# Altium footprint library Cty1.PcbLib: 1378 footprints (part 61 of 87)
Each footprint in its own frame and in the unit in brackets; x right, y up, seen from the top. Pads: shape width x height; smd on the part's side, far side on the other; paste and mask are expansions set on the pad; w line width, h text height; cw(c..) or ccw(c..) is an arc to the next point about the centre after c.
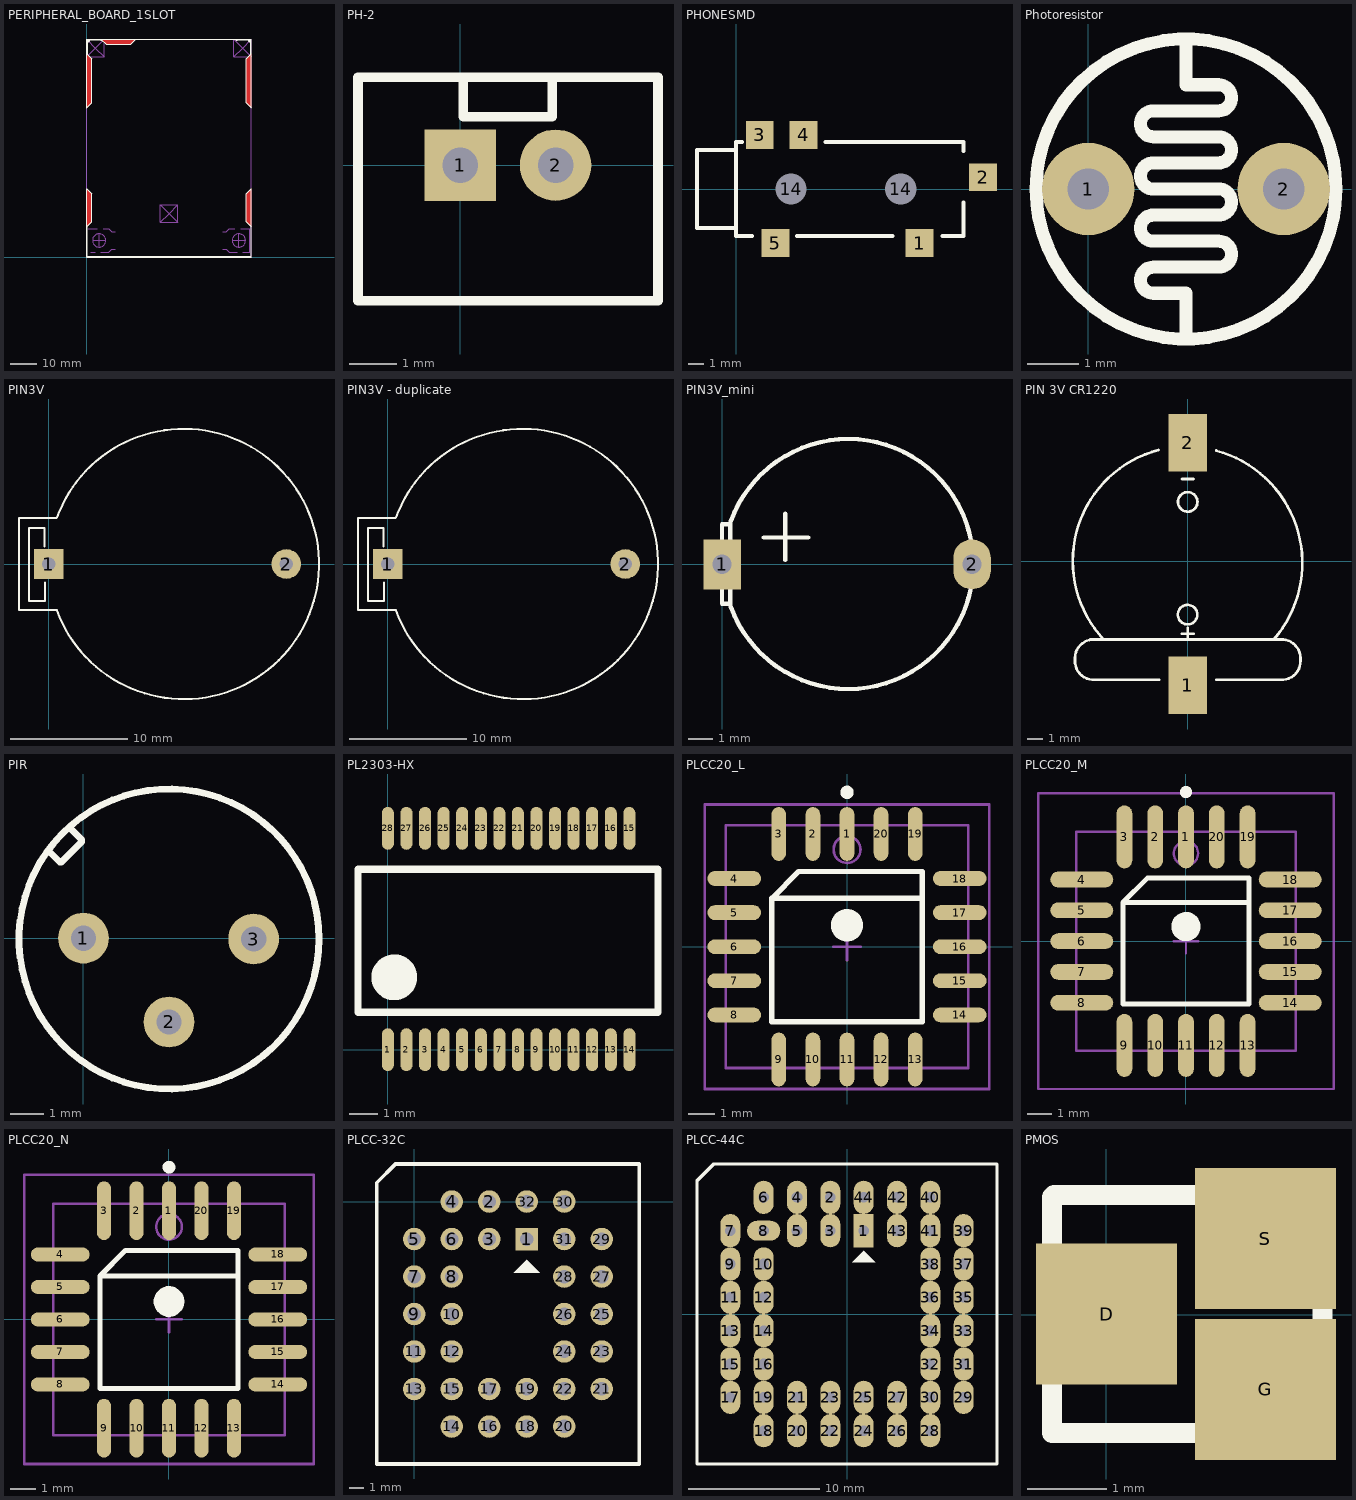
[diagram p60: the footprints below, top view; thin cyan lines are the x and y axes]

## PERIPHERAL_BOARD_1SLOT [mm]
Top Layer:
  region: 18.5,82 16.6,80.1 7.3,80.1 5.4,82
  region: 0,56.3 1.9,58.2 1.9,74.7 0,76.6
  region: 0,11.5 1.9,13.4 1.9,23.8 0,25.7
  region: 62,56.3 60.1,58.2 60.1,74.7 62,76.6
  region: 62,11.5 60.1,13.4 60.1,23.8 62,25.7
Top Overlay:
  region: 0.4,11.8 0,11.8 0,0 0.4,0
  region: 0,0.4 0,0 62,0 62,0.4
  rectangle: 0,81.2 0.8,82
  region: 0,81.5 0,76.6 0.5,76.6 0.5,81.5
  rectangle: 0.5,81.5 5.4,82
  rectangle: 61.6,0 62,11.8
  region: 62,82 61.2,82 61.2,81.2 62,81.2
  region: 61.5,81.5 61.5,76.6 62,76.6 62,81.5
  region: 61.5,82 56.6,82 56.6,81.5 61.5,81.5
  region: 0.5,76.6 0.5,76.1 0,76.6
  region: 0,80.3 1,81.3 0,81.3
  region: 0.7,81 1.7,82 0.7,82
  region: 5.4,81.5 5.9,81.5 5.4,82
  region: 61.5,76.6 61.5,76.1 62,76.6
  region: 62,80.3 61,81.3 62,81.3
  region: 61.3,81 60.3,82 61.3,82
  region: 56.6,81.5 56.1,81.5 56.6,82
  lines w0.2: 0,11.5 1.9,13.4 1.9,23.8 0,25.7 0,0 62,0 62,25.7 60.1,23.8 60.1,13.4 62,11.5 ; 18.5,82 16.6,80.1 7.3,80.1 5.4,82 ; 0,76.6 0,82 5.4,82 ; 0,76.6 0,56.3 1.9,58.2 1.9,74.7 0,76.6 ; 5.4,82 17.5,82 44.5,82 56.6,82 62,82 62,76.6 ; 62,76.6 62,56.3 60.1,58.2 60.1,74.7 62,76.6
Top Solder:
  region: 0,25.7 0,11.521 1.9,13.4 1.9,23.8
  region: 5.346,82.133 18.554,82.133 16.6,80.1 7.3,80.1
  region: 0,76.545 0,56.3 1.9,58.2 1.917,74.639
  region: 62,25.7 62,11.521 60.1,13.4 60.1,23.8
  region: 62,76.672 62,56.3 60.1,58.2 60.1,74.7
Mechanical 5:
  circle w0.1: c4.7,6.3 r2.5
  circle w0.1: c57.3,6.3 r2.5
  lines w0.1: 0.65,10.7 4.04,10.7 ; 1.6,1.9 3.24,1.9 ; 2.21,6.3 7.2,6.3 ; 4.7,3.8 4.7,8.79 ; 5.36,1.9 8.35,1.9 9.4,2.95 10.75,2.95 ; 6.16,10.7 8.35,10.7 9.4,9.65 10.75,9.65 ; 51.25,2.95 52.6,2.95 53.65,1.9 56.64,1.9 ; 51.25,9.65 52.6,9.65 53.65,10.7 55.84,10.7 ; 54.81,6.3 59.8,6.3 ; 57.3,3.8 57.3,8.79 ; 57.96,10.7 61.35,10.7 61.35,1.9 58.76,1.9 ; 0,75.4 6.6,75.4 ; 0,75.4 0,82 ; 0,75.4 3.3,78.7 ; 0,82 6.6,82 ; 0,82 3.3,78.7 ; 0,82 0,0 62,0 62,82 ; 0,82 62,82 ; 3.3,78.7 6.6,82 ; 3.3,78.7 6.6,75.4 ; 6.6,75.4 6.6,82 ; 27.7,13.1 31,16.4 ; 27.7,13.1 27.7,19.7 ; 27.7,13.1 34.3,13.1 ; 27.7,19.7 31,16.4 ; 27.7,19.7 34.3,19.7 ; 31,16.4 34.3,13.1 ; 31,16.4 34.3,19.7 ; 34.3,13.1 34.3,19.7 ; 55.4,75.4 58.7,78.7 ; 55.4,75.4 62,75.4 ; 55.4,75.4 55.4,82 ; 55.4,82 62,82 ; 55.4,82 58.7,78.7 ; 55.4,82 62,82 ; 58.7,78.7 62,75.4 ; 58.7,78.7 62,82 ; 62,75.4 62,82

## PH-2 [mm]
pads (2):
  rect 1.5x1.5 hole 0.75: 1(0,0)
  round 1.5 hole 0.75: 2(2,0)
Top Overlay:
  lines w0.2: 0.061,1.845 0.061,1.016 1.931,1.016 1.931,1.845 ; -2.15,-2.85 4.15,-2.85 4.15,1.85 -2.15,1.85 -2.15,-2.85
Mechanical 7:
  lines w0.2: -0.645,-0.628 0.625,-0.628 0.625,0.642 -0.645,0.642 -0.645,-0.628
3D body "SW3dPS-b2b-ph-ks-1.STEP": height 6, standoff -3, extent -1.934,-2.722 3.966,1.778

## PHONESMD [mm]
pads (7):
  rect 1.778x1.778 smd: 1(11.7,-3.45) 2(15.75,0.75) 3(1.5,3.45) 4(4.3,3.45) 5(2.5,-3.45)
  round 1.778 hole 2 unplated: 14(3.5,0) 14(10.5,0)
Top Overlay:
  lines w0.254: 0,-2.5 -2.5,-2.5 -2.5,2.5 0,2.5 ; 0.381,3 0,3 0,-3 1.016,-3 ; 3.889,-3 9.985,-3 ; 5.7,3 14.5,3 14.5,2.435 ; 13.16,-3 14.5,-3 14.5,-0.867

## Photoresistor [mm]
pads (2):
  round 1.8 hole 0.8: 1(0,0) 2(3.81,0)
Top Overlay:
  circle w0.254: c1.905,0 r2.924
  lines w0.254: 1.905,-2.921 1.905,-2.032 1.27,-2.032 cw(c1.27,-1.778) 1.27,-1.524 2.54,-1.524 ccw(c2.54,-1.27) 2.54,-1.016 1.27,-1.016 cw(c1.27,-0.762) 1.27,-0.508 2.54,-0.508 ccw(c2.54,-0.254) 2.54,0 1.27,0 cw(c1.27,0.254) 1.27,0.508 2.54,0.508 ccw(c2.54,0.762) 2.54,1.016 1.27,1.016 cw(c1.27,1.27) 1.27,1.524 2.54,1.524 ccw(c2.54,1.778) 2.54,2.032 1.905,2.032 1.905,2.921

## PIN3V [mil] "Socket PIN 3V"
pads (2):
  rect 100x100 hole 45: 1(0,0)
  round 100 hole 45: 2(800,0)
Top Overlay:
  lines w7: -14,59 -14,121 -66,121 -66,-124 -13,-124 -13,-63 ; 26.33,155 -100,155 -100,-155 27.93,-155 ; 27.6,156.07 cw(c455,0) 27.93,-156.97
3D body "batter2.STEP": height 278.16, standoff -137.2, extent -128.09,-446.83 1001.83,448.83

## PIN3V - duplicate [mil] "Socket PIN 3V"
pads (2):
  rect 100x100 hole 45: 1(0,0)
  round 100 hole 45: 2(800,0)
Top Overlay:
  lines w7: -14,59 -14,121 -66,121 -66,-124 -13,-124 -13,-63 ; 26.33,155 -100,155 -100,-155 27.93,-155 ; 27.6,156.07 cw(c455,0) 27.93,-156.97
3D body "batter2.STEP": height 278.16, standoff -137.2, extent -128.09,-446.83 1001.83,448.83
3D body "CR 2032 Lithium Cell.step": height 236.22, standoff 110.24, extent 167.6,-403.7 955,383.7

## PIN3V_mini [mil] "Socket PIN 3V"
pads (2):
  rect 60x80 hole 31: 1(0,0)
  oval 60x80 hole 31: 2(400,0)
Top Overlay:
  lines w7: 11,64 0,64 0,-63 13,-63 ; 13,-64 13,65 ; 14,-67.81 ccw(c201.94,0.6) 14,69 ; 67,43 138,43 ; 101,7 101,81

## PIN 3V CR1220 [mil]
pads (2):
  rect 100x150 smd mask+8: 1(0,-325) 2(0,310)
Top Overlay:
  circle w7: c-0.5,-140 r25.5
  circle w7: c0,155 r25.5
  lines w7: -255,-205 250,-205 cw(c245,-255) 295,-260 cw(c247.5,-262.5) 250,-310 75,-310 ; -250,-205 ccw(c-245,-255) -295,-260 ccw(c-247.5,-262.5) -250,-310 -75,-310 ; -220,-205 cw(c0,0) -76.53,290.81 ; -15,-190 15,-190 ; -15,215 15,215 ; 0,-205 0,-175 ; 74.24,289.31 cw(c-5,-5) 225,-205
3D body "CR1220 battery.STEP": height 159.49, standoff -35, extent -295.42,-364.17 295,364.17

## PIR [mil] "Xtal for RF"
pads (3):
  round 60 hole 30: 1(0,0) 2(101,-99) 3(201,-1)
Top Overlay:
  circle w8: c101,-1 r177.17
  lines w8: -41,103 -28,90 -26,90 -2,114 -2,116 -15,129

## PL2303-HX [mil]
pads (28):
  oval 16.53x59.03 smd mask+7.9: 1(0,0) 2(25.6,0) 3(51.18,0) 4(76.78,0) 5(102.37,0) 6(127.97,0) 7(153.57,0) 8(179.15,0) 9(204.75,0) 10(230.35,0) 11(255.93,0) 12(281.53,0) 13(307.12,0) 14(332.7,0) 15(332.7,305) 16(307.12,305) 17(281.53,305) 18(255.93,305) 19(230.35,305) 20(204.75,305) 21(179.15,305) 22(153.57,305) 23(127.97,305) 24(102.37,305) 25(76.78,305) 26(51.18,305) 27(25.6,305) 28(0,305)
Top Overlay:
  circle w39.37: c8.8,99.7 r11.88
  lines w10: -41.22,51.66 -41.22,248.53 372.21,248.53 372.21,51.66 -41.22,51.66
3D body "SOP65P770x200-28N.step": height 84.65, standoff 0, extent -37.01,0.01 369.69,305.35

## PLCC20_L [mm] "Leaded Chip Carrier, 20-Leads, Body 9x9mm, Pitch 1.27mm, IPC High Density"
height 4.57
pads (20):
  oval 0.55x2 smd: 1(0,4.2) 2(-1.27,4.2) 3(-2.54,4.2) 9(-2.54,-4.2) 10(-1.27,-4.2) 11(0,-4.2) 12(1.27,-4.2) 13(2.54,-4.2) 19(2.54,4.2) 20(1.27,4.2)
  oval 2x0.55 smd: 4(-4.2,2.54) 5(-4.2,1.27) 6(-4.2,0) 7(-4.2,-1.27) 8(-4.2,-2.54) 14(4.2,-2.54) 15(4.2,-1.27) 16(4.2,0) 17(4.2,1.27) 18(4.2,2.54)
Top Overlay:
  circle w0.6: c0,0.8 r0.3
  circle w0.25: c0,5.75 r0.125
  lines w0.2: 2.8,1.8 -2.8,1.8 ; -2.8,1.8 -2.8,-2.8 2.8,-2.8 2.8,2.8 -1.8,2.8 -2.8,1.8
Mechanical 13:
  circle w0.1: c0,3.62 r0.5
  lines w0.1: -4.52,-4.52 4.52,-4.52 4.52,4.52 -4.52,4.52 -4.52,-4.52
Mechanical 15:
  lines w0.1: -0.5,0 0.5,0 ; 0,-0.5 0,0.5 ; -5.3,-5.3 5.3,-5.3 5.3,5.3 -5.3,5.3 -5.3,-5.3
3D body: height 4.57, standoff 0, extent -4.52,-4.52 4.52,4.52

## PLCC20_M [mm] "Leaded Chip Carrier, 20-Leads, Body 9x9mm, Pitch 1.27mm, IPC Low Density"
height 4.57
pads (20):
  oval 0.65x2.6 smd: 1(0,4.3) 2(-1.27,4.3) 3(-2.54,4.3) 9(-2.54,-4.3) 10(-1.27,-4.3) 11(0,-4.3) 12(1.27,-4.3) 13(2.54,-4.3) 19(2.54,4.3) 20(1.27,4.3)
  oval 2.6x0.65 smd: 4(-4.3,2.54) 5(-4.3,1.27) 6(-4.3,0) 7(-4.3,-1.27) 8(-4.3,-2.54) 14(4.3,-2.54) 15(4.3,-1.27) 16(4.3,0) 17(4.3,1.27) 18(4.3,2.54)
Top Overlay:
  circle w0.25: c0,6.15 r0.125
  circle w0.6: c0,0.6 r0.3
  lines w0.2: 2.6,1.6 -2.6,1.6 ; -2.6,1.6 -1.6,2.6 2.6,2.6 2.6,-2.6 -2.6,-2.6 -2.6,1.6
Mechanical 13:
  circle w0.1: c0,3.62 r0.5
  lines w0.1: -4.52,-4.52 -4.52,4.52 4.52,4.52 4.52,-4.52 -4.52,-4.52
Mechanical 15:
  lines w0.1: -0.5,0 0.5,0 ; 0,-0.5 0,0.5 ; -6.1,-6.1 -6.1,6.1 6.1,6.1 6.1,-6.1 -6.1,-6.1
3D body: height 4.57, standoff 0, extent -4.52,-4.52 4.52,4.52

## PLCC20_N [mm] "Leaded Chip Carrier, 20-Leads, Body 9x9mm, Pitch 1.27mm, IPC Medium Density"
height 4.57
pads (20):
  oval 0.55x2.3 smd: 1(0,4.25) 2(-1.27,4.25) 3(-2.54,4.25) 9(-2.54,-4.25) 10(-1.27,-4.25) 11(0,-4.25) 12(1.27,-4.25) 13(2.54,-4.25) 19(2.54,4.25) 20(1.27,4.25)
  oval 2.3x0.55 smd: 4(-4.25,2.54) 5(-4.25,1.27) 6(-4.25,0) 7(-4.25,-1.27) 8(-4.25,-2.54) 14(4.25,-2.54) 15(4.25,-1.27) 16(4.25,0) 17(4.25,1.27) 18(4.25,2.54)
Top Overlay:
  circle w0.6: c0,0.7 r0.3
  circle w0.25: c0,5.95 r0.125
  lines w0.2: 2.7,1.7 -2.7,1.7 ; -2.7,1.7 -2.7,-2.7 2.7,-2.7 2.7,2.7 -1.7,2.7 -2.7,1.7
Mechanical 13:
  circle w0.1: c0,3.62 r0.5
  lines w0.1: -4.52,-4.52 4.52,-4.52 4.52,4.52 -4.52,4.52 -4.52,-4.52
Mechanical 15:
  lines w0.1: -0.5,0 0.5,0 ; 0,-0.5 0,0.5 ; -5.65,-5.65 5.65,-5.65 5.65,5.65 -5.65,5.65 -5.65,-5.65
3D body: height 4.57, standoff 0, extent -4.52,-4.52 4.52,4.52

## PLCC-32C [mil] "Socket PLCC32R"
height 200
pads (32):
  rect 60x60 hole 36: 1(300,-100)
  round 60 hole 36: 2(200,0) 3(200,-100) 4(100,0) 5(0,-100) 6(100,-100) 7(0,-200) 8(100,-200) 9(0,-300) 10(100,-300) 11(0,-400) 12(100,-400) 13(0,-500) 14(100,-600) 15(100,-500) 16(200,-600) 17(200,-500) 18(300,-600) 19(300,-500) 20(400,-600) 21(500,-500) 22(400,-500) 23(500,-400) 24(400,-400) 25(500,-300) 26(400,-300) 27(500,-200) 28(400,-200) 29(500,-100) 30(400,0) 31(400,-100) 32(300,0)
Top Overlay:
  region: 300,-155 265,-190 335,-190
  lines w10: -100,-700 -100,50 -50,100 600,100 600,-700 -100,-700

## PLCC-44C [mil] "QPC-44C"
height 200
pads (44):
  rect 60x100 hole 32: 1(50,250)
  oval 60x100 hole 32: 2(-50,350) 3(-50,250) 4(-150,350) 5(-150,250) 6(-250,350) 7(-350,250) 9(-350,150) 10(-250,150) 11(-350,50) 12(-250,50) 13(-350,-50) 14(-250,-50) 15(-350,-150) 16(-250,-150) 17(-350,-250) 18(-250,-350) 19(-250,-250) 20(-150,-350) 21(-150,-250) 22(-50,-350) 23(-50,-250) 24(50,-350) 25(50,-250) 26(150,-350) 27(150,-250) 28(250,-350) 29(350,-250) 30(250,-250) 31(350,-150) 32(250,-150) 33(350,-50) 34(250,-50) 35(350,50) 36(250,50) 37(350,150) 38(250,150) 39(350,250) 40(250,350) 41(250,250) 42(150,350) 43(150,250) 44(50,350)
  oval 100x60 hole 32: 8(-250,250)
Top Overlay:
  region: 50,190 15,155 85,155
  lines w10: -450,-450 -450,400 -400,450 450,450 450,-450 -450,-450

## PMOS [mil]
pads (3):
  rect 70x70 smd: D(0.25,0.25) G(78.99,-37.15) S(78.99,37.65)
Top Overlay:
  lines w10: -26.75,-58.75 107.25,-58.75 107.25,59.25 -25.75,59.25 -26.75,58.25 -26.75,-58.75